# Altium schematic symbol library BARKO_SCHLIB.SchLib: 1064 symbols (part 10 of 11) (continued)
## R-430R-1206 (continued)
RES 430 OHM 1% 1/4W 1206; Manufacturer: Stackpole Electronics; Manufacturer Part Number: RMCF1206FT430R; Max Power Dissipation: 250mW; Temperature Coefficient: 100ppm/°C; .Creator: M.OZKAN; .PCBCHK: USED; Supplier 1: Digi-Key; Supplier Part Number 1: RMCF1206FT430RCT-ND; Stock: 2230; Pricing: 1=0.1, 10=0.034, 100=0.014, 1000=0.0063, 2500=0.0055 (USD); RoHS: Yes; Mount: Surface Mount; Contact Plating: Tin,Matte; Case Code (Imperial): 1206; Case Code (Metric): 3216; Min Operating Temperature: -55°C; Max Operating Temperature: 155°C; Packaging: Tape and Reel; Resistance: 430R; Package Quantity: 5000; Features: Automotive AEC-Q200; Number of Terminations: 2; Composition: Thick Film; Length: 0.126inch; Height: 0.028inch; Width: 0.063inch; Radiation Hardening: No; ComponentLink1URL: https://www.seielect.com/catalog/SEI-RMCF_RMCP.pdf?src-supplier=Avnet; ComponentLink1Description: https://www.seielect.com/catalog/SEI-RMCF_RMCP.pdf?src-supplier=Avnet; ComponentLink2URL: https://www.seielect.com/Catalog/SEI-RMCF_RMCP.pdf?src-supplier=Digi-Key; ComponentLink2Description: https://www.seielect.com/Catalog/SEI-RMCF_RMCP.pdf?src-supplier=Digi-Key; ComponentLink3URL: http://www.seielect.com/Catalog/SEI-RMCF_RMCP.pdf?src-supplier=Digi-Key; ComponentLink3Description: http://www.seielect.com/Catalog/SEI-RMCF_RMCP.pdf?src-supplier=Digi-Key; .SCHCHK: USED
footprint R-1206
pins: 1, 2

## R-470-0603-0.1
designator R?, comment 470R  Tolerance: 0.1%  Case/Package: 0603
RES SMD 470 OHM 0.1% 1/5W 0603; Manufacturer: Panasonic; Manufacturer Part Number: ERJ-PB3B4700V; Max Power Dissipation: 200mW; Temperature Coefficient: 50ppm/°C; Supplier 1: Digi-Key; Supplier Part Number 1: P19934CT-ND; Stock: 5949; Pricing: 1=0.23, 10=0.191, 25=0.1392, 50=0.101, 100=0.0748, 250=0.0574, 500=0.0452, 1000=0.0313 (USD); RoHS: Yes; Case Code (Metric): 1608; Case Code (Imperial): 0603; Min Operating Temperature: -55°C; Max Operating Temperature: 155°C; Packaging: Tape and Reel; Resistance: 470R; Resistor Type: Thick Film; Number of Terminations: 2; Features: Automotive AEC-Q200; Length: 0.063inch; Width: 0.032inch; Height - Seated (Max): 0.022inch; ComponentLink1URL: https://industrial.panasonic.com/sa/system/files/data/download/catalog/id_fixed-resistors_e_2.pdf?src-supplier=Digi-Key; ComponentLink1Description: https://industrial.panasonic.com/sa/system/files/data/download/catalog/id_fixed-resistors_e_2.pdf?src-supplier=Digi-Key
footprint R-0603
pins: 1, 2

## R-470K-0805
designator R?, comment 470K  Case Code (Imperial): 0805
RES SMD 470K 1/8W5%  0805; Manufacturer: Panasonic; Manufacturer Part Number: ERJ-6ENF4703V; Resistance: 470kR; Tolerance: 1%; Temperature Coefficient: 100ppm/°C; Max Power Dissipation: 125mW; Voltage Rating: 150V; .PCBCHK: USED; .Creator: F:TALI; Washability: OK; Stock 1: 202505; Pricing 1: 1=0.1, 10=0.081, 100=0.0311, 1000=0.01367, 2500=0.01181 (USD); Mount: Surface Mount; Case/Package: 0805; Number of Pins: 2; Case Code (Metric): 2012; Contact Plating: Tin; Min Operating Temperature: -55°C; Max Operating Temperature: 155°C; Packaging: Tape and Reel; Composition: Thick Film; Number of Terminations: 2; Features: Automotive AEC-Q200; Package Quantity: 1; Military Standard: Not; Power Rating: 125mW; Termination: SMD/SMT; Length: 2mm; Height: 0.6mm; Width: 1.2mm; Depth: 1.25mm; Radiation Hardening: No; REACH SVHC: No SVHC; ComponentLink1URL: http://www.farnell.com/datasheets/1678782.pdf; ComponentLink1Description: http://www.farnell.com/datasheets/1678782.pdf; ComponentLink2URL: http://www.mouser.com/ds/2/315/AOA0000CE2-37512.pdf; ComponentLink2Description: http://www.mouser.com/ds/2/315/AOA0000CE2-37512.pdf; ComponentLink3URL: https://www.alliedelec.com/m/d/623f45ff1957d936ff56d46fd1c28cac.pdf; ComponentLink3Description: https://www.alliedelec.com/m/d/623f45ff1957d936ff56d46fd1c28cac.pdf; ComponentLink4URL: http://www.farnell.com/datasheets/426256.pdf; ComponentLink4Description: http://www.farnell.com/datasheets/426256.pdf; ComponentLink5URL: http://industrial.panasonic.com/www-data/pdf/AOA0000/AOA0000CE2.pdf; ComponentLink5Description: http://industrial.panasonic.com/www-data/pdf/AOA0000/AOA0000CE2.pdf; Stock 2: 199283; Pricing 2: 1=0.1, 10=0.059, 100=0.024, 1000=0.01079, 2500=0.00936 (USD); Voltage Rating (DC): 150V; Lead Free: Lead Free; ComponentLink6URL: http://www.samsungsem.com/kr/support/product-search/chip-resistor/RC2012F474CS.jsp; ComponentLink6Description: http://www.samsungsem.com/kr/support/product-search/chip-resistor/RC2012F474CS.jsp; ComponentLink7URL: http://www.samsungsem.com/kr/support/library/product-catalog/__icsFiles/afieldfile/2015/09/22/CHIP_RESISTOR_2015.pdf; ComponentLink7Description: http://www.samsungsem.com/kr/support/library/product-catalog/__icsFiles/afieldfile/2015/09/22/CHIP_RESISTOR_2015.pdf; Stock 3: 30342; Pricing 3: 1=0.1, 10=0.021, 100=0.0086, 1000=0.00385, 2500=0.00334 (USD); .SCHCHK: USED; Supplier 1: Digi-Key; Supplier Part Number 1: RMCF0805JT470KDKR-ND
footprint R-0805
pins: 1, 2

## R-470R-0603
designator R?, comment 470R  Case Code (Imperial): 0603
RES SMD 470 OHM 5% 1/10W 0603; Manufacturer: Yageo; Manufacturer Part Number: RC0603JR-07470RL; Temperature Coefficient: 100ppm/°C; Voltage Rating (DC): 50V; Power Rating: 100mW; .PCBCHK: USED; .Creator: F:TALI; Washability: OK; Stock 1: 0; Pricing 1: 1=0.1, 10=0.022, 100=0.0088, 1000=0.00396, 2500=0.00344 (USD); Case/Package: 0603; Number of Pins: 2; Case Code (Metric): 1608; Min Operating Temperature: -55°C; Max Operating Temperature: 155°C; Resistance: 470R; Tolerance: 5%; Composition: Thick Film; Packaging: Tape and Reel; Voltage Rating: 50V; Package Quantity: 1; Termination: SMD/SMT; Number of Terminations: 2; Military Standard: Not; Max Power Dissipation: 100mW; Features: Moisture Resistant; Length: 0.063inch; Height: 0.022inch; Width: 0.031inch; Depth: 0.8mm; REACH SVHC: No SVHC; Lead Free: Lead Free; ComponentLink1URL: http://www.yageo.com/documents/recent/PYu-RC_Group_51_RoHS_L_9.pdf; ComponentLink1Description: http://www.yageo.com/documents/recent/PYu-RC_Group_51_RoHS_L_9.pdf; ComponentLink2URL: http://www.farnell.com/datasheets/443971.pdf; ComponentLink2Description: http://www.farnell.com/datasheets/443971.pdf; Stock 2: 2603; Pricing 2: 1=0.1, 10=0.044, 100=0.0178, 1000=0.00798, 2500=0.00693 (USD); Stock 3: 2783393; Pricing 3: 1=0.1, 10=0.043, 100=0.0176, 1000=0.00791, 2500=0.00686 (USD); Mount: Surface Mount; Weight: 7.1E-05oz; Contact Plating: Tin; Radiation Hardening: No; ComponentLink3URL: http://www.farnell.com/datasheets/1678796.pdf; ComponentLink3Description: http://www.farnell.com/datasheets/1678796.pdf; ComponentLink4URL: http://industrial.panasonic.com/www-data/pdf/AOA0000/AOA0000CE1.pdf; ComponentLink4Description: http://industrial.panasonic.com/www-data/pdf/AOA0000/AOA0000CE1.pdf; ComponentLink5URL: https://www.alliedelec.com/m/d/51cd0790071e1666bdb9d00c57fcf960.pdf; ComponentLink5Description: https://www.alliedelec.com/m/d/51cd0790071e1666bdb9d00c57fcf960.pdf; ComponentLink6URL: https://www.verical.com/server-webapp/html/getDatasheet?partID=33087; ComponentLink6Description: https://www.verical.com/server-webapp/html/getDatasheet?partID=33087; ComponentLink7URL: http://www.farnell.com/datasheets/2059623.pdf; ComponentLink7Description: http://www.farnell.com/datasheets/2059623.pdf; ComponentLink8URL: https://www.verical.com/server-webapp/html/getDatasheet?partID=493439; ComponentLink8Description: https://www.verical.com/server-webapp/html/getDatasheet?partID=493439; .SCHCHK: USED; Supplier 1: Digi-Key; Supplier Part Number 1: 311-470GRDKR-ND
footprint R-0603
pins: 1, 2

## R-470R-0804
designator R?, comment 470R
RES ARRAY 4 RES 470 OHM 0804; Manufacturer: Stackpole Electronics; Manufacturer Part Number: RAVF104DJT470R; Circuit Type: Isolated; Number of Resistors: 4; Power Per Element: 62.5mW; Tolerance: 5%; Temperature Coefficient: 200ppm/°C; Supplier 1: Digi-Key; RoHS: Yes; Category: Resistor Arrays; Stock 1: 9036; Pricing 1: 1=0.10000, 10=0.05800, 25=0.04200, 50=0.03200, 100=0.02360, 250=0.01800, 500=0.01440, 1000=0.01060, 5000=0.00760 (USD); Mount: Surface Mount; Case/Package: 0804; Number of Pins: 8; Min Operating Temperature: -55°C; Max Operating Temperature: 155°C; Package Quantity: 1; Resistance: 470R; Packaging: Tape and Reel; Length: 0.079inch; Width: 0.039inch; Height: 0.02inch; ComponentLink1URL: https://www.seielect.com/catalog/SEI-Packaging.pdf?src-supplier=Digi-Key; ComponentLink1Description: https://www.seielect.com/catalog/SEI-Packaging.pdf?src-supplier=Digi-Key; Supplier Part Number 1: RAVF104DJT470RCT-ND
footprint R-0804 (SMD, 8-Leads, Body 2x1mm, Pitch 0.5mm)
pins: 1, 2, 3, 4, 5, 6, 7, 8

## R-470R-0805
designator R?, comment 470R  Case Code (Imperial): 0805
RES SMD 470 OHM 1/8W 5% 0805; Manufacturer: Yageo; Manufacturer Part Number: RC0805JR-07470RL; Power Rating: 125mW; Temperature Coefficient: 100ppm/°C; Voltage Rating: 150V; .PCBCHK: USED; .Creator: F:TALI; Washability: OK; Stock 1: 316867; Pricing 1: 1=0.1, 10=0.039, 100=0.0159, 1000=0.00716, 2500=0.00622 (USD); Case/Package: 0805; Contact Plating: Lead,Matte,Tin; Case Code (Metric): 2012; Min Operating Temperature: -55°C; Max Operating Temperature: 155°C; Tolerance: 5%; Resistance: 470R; Packaging: Tape and Reel; Composition: Thick Film; Termination: SMD/SMT; Military Standard: Not; Length: 2mm; Depth: 1.25mm; Radiation Hardening: No; REACH SVHC: Unknown; Lead Free: Lead Free; ComponentLink1URL: http://www.yageo.com/documents/recent/PYu-RC_Group_51_RoHS_L_9.pdf; ComponentLink1Description: http://www.yageo.com/documents/recent/PYu-RC_Group_51_RoHS_L_9.pdf; ComponentLink2URL: https://www.verical.com/server-webapp/html/getDatasheet?partID=330937; ComponentLink2Description: https://www.verical.com/server-webapp/html/getDatasheet?partID=330937; ComponentLink3URL: http://www.mouser.com/ds/2/447/Yageo_08112016_RC0805-968729.pdf; ComponentLink3Description: http://www.mouser.com/ds/2/447/Yageo_08112016_RC0805-968729.pdf; ComponentLink4URL: http://www.yageo.ru/pdf/RC0805.pdf; ComponentLink4Description: http://www.yageo.ru/pdf/RC0805.pdf; ComponentLink5URL: http://www.farnell.com/datasheets/442941.pdf; ComponentLink5Description: http://www.farnell.com/datasheets/442941.pdf; ComponentLink6URL: http://www.farnell.com/datasheets/444164.pdf; ComponentLink6Description: http://www.farnell.com/datasheets/444164.pdf; Stock 2: 1251140; Pricing 2: 1=0.1, 10=0.061, 100=0.0249, 1000=0.0112, 2500=0.00972 (USD); Mount: Surface Mount; Package Quantity: 5000; Number of Terminations: 2; Max Power Dissipation: 125mW; Voltage Rating (DC): 150V; Height: 0.6mm; Width: 1.25mm; ComponentLink7URL: https://www.alliedelec.com/m/d/51cd0790071e1666bdb9d00c57fcf960.pdf; ComponentLink7Description: https://www.alliedelec.com/m/d/51cd0790071e1666bdb9d00c57fcf960.pdf; ComponentLink8URL: http://industrial.panasonic.com/www-data/pdf/AOA0000/AOA0000CE1.pdf; ComponentLink8Description: http://industrial.panasonic.com/www-data/pdf/AOA0000/AOA0000CE1.pdf; ComponentLink9URL: http://www.farnell.com/datasheets/2371628.pdf; ComponentLink9Description: http://www.farnell.com/datasheets/2371628.pdf; ComponentLink10URL: http://www.mouser.com/ds/2/315/AOA0000CE1-37422.pdf; ComponentLink10Description: http://www.mouser.com/ds/2/315/AOA0000CE1-37422.pdf; ComponentLink11URL: http://www.farnell.com/datasheets/1678796.pdf; ComponentLink11Description: http://www.farnell.com/datasheets/1678796.pdf; ComponentLink12URL: http://www.farnell.com/datasheets/1500035.pdf; ComponentLink12Description: http://www.farnell.com/datasheets/1500035.pdf; ComponentLink13URL: http://www.jameco.com/Jameco/Products/ProdDS/1989922.pdf; ComponentLink13Description: http://www.jameco.com/Jameco/Products/ProdDS/1989922.pdf; Stock 3: 65717; Pricing 3: 1=0.1, 10=0.033, 100=0.0133, 1000=0.00598, 2500=0.00519 (USD); Features: Moisture Resistant; Thickness: 508um; ComponentLink14URL: http://www.farnell.com/datasheets/1791942.pdf; ComponentLink14Description: http://www.farnell.com/datasheets/1791942.pdf; ComponentLink15URL: http://www.bourns.com/pdfs/chpreztr.pdf; ComponentLink15Description: http://www.bourns.com/pdfs/chpreztr.pdf; ComponentLink16URL: https://www.bourns.com/docs/Product-Datasheets/CHPREZTR.pdf; ComponentLink16Description: https://www.bourns.com/docs/Product-Datasheets/CHPREZTR.pdf; ComponentLink17URL: http://www.bourns.com/docs/Product-Datasheets/CHPREZTR.pdf; ComponentLink17Description: http://www.bourns.com/docs/Product-Datasheets/CHPREZTR.pdf; .SCHCHK: USED; Supplier 1: Digi-Key; Supplier Part Number 1: 311-470ARCT-ND
footprint R-0805
pins: 1, 2

## R-470R-1206 Array
designator R?, comment 470R
RES ARRAY 4 RES 470 OHM 0804; Manufacturer: Stackpole Electronics; Manufacturer Part Number: RAVF104DJT470R; Circuit Type: Isolated; Number of Resistors: 4; Power Per Element: 62.5mW; Tolerance: 5%; Temperature Coefficient: 200ppm/°C; Supplier 1: Digi-Key; RoHS: Yes; Category: Resistor Arrays; Stock 1: 9036; Pricing 1: 1=0.10000, 10=0.05800, 25=0.04200, 50=0.03200, 100=0.02360, 250=0.01800, 500=0.01440, 1000=0.01060, 5000=0.00760 (USD); Mount: Surface Mount; Case/Package: 0804; Number of Pins: 8; Min Operating Temperature: -55°C; Max Operating Temperature: 155°C; Package Quantity: 1; Resistance: 470R; Packaging: Tape and Reel; Length: 0.079inch; Width: 0.039inch; Height: 0.02inch; ComponentLink1URL: https://www.seielect.com/catalog/SEI-Packaging.pdf?src-supplier=Digi-Key; ComponentLink1Description: https://www.seielect.com/catalog/SEI-Packaging.pdf?src-supplier=Digi-Key; Supplier Part Number 1: RAVF104DJT470RCT-ND
footprint R-1206-ARRAY (SMD, 8-Leads, Body 1.6x3.2mm, Pitch 0.8mm)
pins: 1, 2, 3, 4, 5, 6, 7, 8

## R-470R-2512
designator R?, comment 470R  Case/Package: 2512  Power Rating: 1W
RES SMD 470 OHM 1% 1W 2512; Manufacturer: Stackpole Electronics; Manufacturer Part Number: CQ121WF4700T4E; Temperature Coefficient: 100ppm/°C; Supplier 1: Digi-Key; Supplier Part Number 1: RMCF2512FT470RCT-ND; Stock: 5190; Pricing: 1=0.34, 10=0.292, 100=0.114, 1000=0.0477 (USD); RoHS: Yes; Mount: Surface Mount; Case Code (Imperial): 2512; Contact Plating: Tin,Matte; Case Code (Metric): 6432; Min Operating Temperature: -55°C; Max Operating Temperature: 155°C; Composition: Thick Film; Number of Terminations: 2; Features: Automotive AEC-Q200; Packaging: Tape and Reel; Resistance: 470R; Length: 0.248inch; Height: 0.028inch; Width: 0.126inch; Radiation Hardening: No; Lead Free: Lead Free; ComponentLink1URL: https://www.seielect.com/Catalog/SEI-RMCF_RMCP.pdf?src-supplier=Digi-Key; ComponentLink1Description: https://www.seielect.com/Catalog/SEI-RMCF_RMCP.pdf?src-supplier=Digi-Key; ComponentLink2URL: https://www.seielect.com/catalog/SEI-Packaging.pdf?src-supplier=Digi-Key; ComponentLink2Description: https://www.seielect.com/catalog/SEI-Packaging.pdf?src-supplier=Digi-Key; ComponentLink3URL: https://www.seielect.com/catalog/SEI-RMCF_RMCP.pdf?src-supplier=Avnet; ComponentLink3Description: https://www.seielect.com/catalog/SEI-RMCF_RMCP.pdf?src-supplier=Avnet; Max Power Dissipation: 1W; Tolerance: 1%
footprint R-2512
pins: 1, 2

## R-499R-0402
designator R?, comment 499R  Case/Package: 0402
RES SMD 499 OHM 1% 1/10W 0402; Manufacturer: Panasonic; Manufacturer Part Number: ERJ-2RKF4990X; Power Rating: 100mW; Voltage Rating: 50V; Temperature Coefficient: 100ppm/°C; Washability: OK; .Creator: M.OZKAN; .PCBCHK: USED; Supplier 1: Digi-Key; Stock 1: 4738237; Pricing 1: 1=0.10000, 10=0.04100, 100=0.01670, 1000=0.00751, 2500=0.00652, 5000=0.00538 (USD); RoHS: Yes; Mount: Surface Mount; Case Code (Metric): 1005; Case Code (Imperial): 0402; Contact Plating: Tin; Min Operating Temperature: -55°C; Max Operating Temperature: 155°C; Resistance: 499R; Tolerance: 1%; Packaging: Tape and Reel; Package Quantity: 1; Composition: Thick Film; Number of Terminations: 2; Termination: SMD/SMT; Military Standard: Not; Max Power Dissipation: 100mW; Voltage Rating (DC): 50V; Features: Automotive AEC-Q200; Length: 1mm; Height: 0.35mm; Width: 0.02inch; Depth: 0.5mm; REACH SVHC: No SVHC; Lead Free: Lead Free; ComponentLink1URL: https://datasheet.ciiva.com/9181/aoa0000ce2-9181461.pdf?src-supplier=Avnet; ComponentLink1Description: https://datasheet.ciiva.com/9181/aoa0000ce2-9181461.pdf?src-supplier=Avnet; ComponentLink2URL: https://datasheet.ciiva.com/28695/1678782-28695781.pdf?src-supplier=Element14; ComponentLink2Description: https://datasheet.ciiva.com/28695/1678782-28695781.pdf?src-supplier=Element14; ComponentLink3URL: https://datasheet.ciiva.com/22749/1678782-22749610.pdf?src-supplier=Element14; ComponentLink3Description: https://datasheet.ciiva.com/22749/1678782-22749610.pdf?src-supplier=Element14; ComponentLink4URL: https://datasheet.ciiva.com/16508/aoa0000ce2-16508382.pdf?src-supplier=Future+Electronics; ComponentLink4Description: https://datasheet.ciiva.com/16508/aoa0000ce2-16508382.pdf?src-supplier=Future+Electronics; ComponentLink5URL: https://datasheet.ciiva.com/16765/70260748-16765054.pdf?src-supplier=Allied+Electronics; ComponentLink5Description: https://datasheet.ciiva.com/16765/70260748-16765054.pdf?src-supplier=Allied+Electronics; ComponentLink6URL: https://datasheet.ciiva.com/16766/70260748-16766015.pdf?src-supplier=Allied+Electronics; ComponentLink6Description: https://datasheet.ciiva.com/16766/70260748-16766015.pdf?src-supplier=Allied+Electronics; ComponentLink7URL: https://datasheet.ciiva.com/6201/426256-6201373.pdf?src-supplier=Farnell; ComponentLink7Description: https://datasheet.ciiva.com/6201/426256-6201373.pdf?src-supplier=Farnell; ComponentLink8URL: https://datasheet.ciiva.com/46377/426256-46377550.pdf?src-supplier=Element14; ComponentLink8Description: https://datasheet.ciiva.com/46377/426256-46377550.pdf?src-supplier=Element14; Supplier Part Number 1: P499LDKR-ND; .SCHCHK: USED
footprint R-0402
pins: 1, 2

## R-560R-0603
designator R?, comment 560R  Tolerance: 1%  Case/Package: 0603
RES 560 OHM 1% 1/10W 0603; Manufacturer: Stackpole Electronics; Manufacturer Part Number: RMCF0603FT560R; Max Power Dissipation: 100mW; Temperature Coefficient: 100ppm/°C; Washability: OK; .Creator: M.OZKAN; .PCBCHK: USED; Supplier 1: Digi-Key; Supplier Part Number 1: 738-RMCF0603FT560RCT-ND; Stock: 13434; Pricing: 1=0.1, 10=0.016, 100=0.0065, 1000=0.0029, 2500=0.0025 (USD); RoHS: Yes; Mount: Surface Mount; Case Code (Imperial): 0603; Contact Plating: Tin,Matte; Case Code (Metric): 1608; Min Operating Temperature: -55°C; Max Operating Temperature: 155°C; Number of Terminations: 2; Packaging: Tape and Reel; Resistance: 560R; Features: Automotive AEC-Q200; Composition: Thick Film; Length: 0.061inch; Height: 0.022inch; Width: 0.031inch; Radiation Hardening: No; ComponentLink1URL: http://components.arrow.com/part/dataview/50496401S229652N1174?src-supplier=Arrow; ComponentLink1Description: http://components.arrow.com/part/dataview/50496401S229652N1174?src-supplier=Arrow; ComponentLink2URL: https://www.seielect.com/catalog/SEI-RMCF_RMCP.pdf?src-supplier=Avnet; ComponentLink2Description: https://www.seielect.com/catalog/SEI-RMCF_RMCP.pdf?src-supplier=Avnet; ComponentLink3URL: https://www.seielect.com/catalog/SEI-Packaging.pdf?src-supplier=Digi-Key; ComponentLink3Description: https://www.seielect.com/catalog/SEI-Packaging.pdf?src-supplier=Digi-Key; .SCHCHK: USED
footprint R-0603
pins: 1, 2

## R-560R-1206
designator R?, comment 560R  Tolerance: 1%  Case/Package: 1206
RES SMD 560 OHM 1% 1/4W 1206; Manufacturer: Stackpole Electronics; Manufacturer Part Number: RMCF1206FT560R; Max Power Dissipation: 250mW; Temperature Coefficient: 100ppm/°C; .Creator: M.OZKAN; .PCBCHK: USED; Supplier 1: Digi-Key; Supplier Part Number 1: RMCF1206FT560RCT-ND; Stock: 2796; Pricing: 1=0.1, 10=0.034, 100=0.014, 1000=0.0063, 2500=0.0055 (USD); RoHS: Yes; Mount: Surface Mount; Case Code (Imperial): 1206; Contact Plating: Tin,Matte; Case Code (Metric): 3216; Min Operating Temperature: -55°C; Max Operating Temperature: 155°C; Resistance: 560R; Features: Automotive AEC-Q200; Packaging: Tape and Reel; Composition: Thick Film; Number of Terminations: 2; Length: 0.126inch; Height: 0.028inch; Width: 0.063inch; Radiation Hardening: No; Lead Free: Lead Free; ComponentLink1URL: https://www.seielect.com/Catalog/SEI-RMCF_RMCP.pdf?src-supplier=Digi-Key; ComponentLink1Description: https://www.seielect.com/Catalog/SEI-RMCF_RMCP.pdf?src-supplier=Digi-Key; ComponentLink2URL: https://www.seielect.com/catalog/SEI-RMCF_RMCP.pdf?src-supplier=Avnet; ComponentLink2Description: https://www.seielect.com/catalog/SEI-RMCF_RMCP.pdf?src-supplier=Avnet; .SCHCHK: USED
footprint R-1206
pins: 1, 2

## R-680K-0603
designator R?, comment 680K  Tolerance: 1%  Case/Package: 0603
RES 100K OHM 1% 1/10W 0603; Manufacturer: Stackpole Electronics; Manufacturer Part Number: RMCF0603FT100K; Resistance: 100kR; Temperature Coefficient: 100ppm/°C; Max Power Dissipation: 100mW; Working Voltage: 75V; Washability: OK; .Creator: M.OZKAN; .PCBCHK: USED; Supplier 1: Digi-Key; Supplier Part Number 1: RMCF0603FT100KCT-ND; Stock: 1121112; Pricing: 1=0.1, 10=0.016, 100=0.0065, 1000=0.0029, 2500=0.0025 (USD); RoHS: Yes; Mount: Surface Mount; Contact Plating: Tin,Matte; Case Code (Metric): 1608; Case Code (Imperial): 0603; Min Operating Temperature: -55°C; Max Operating Temperature: 155°C; Composition: Thick Film; Features: Automotive AEC-Q200; Packaging: Tape and Reel; Number of Terminations: 2; Power Rating: 100mW; Military Standard: Not; Length: 1.55mm; Height: 0.022inch; Width: 0.031inch; Depth: 0.8mm; Radiation Hardening: No; Lead Free: Lead Free; ComponentLink1URL: https://datasheet.ciiva.com/15193/getdatasheetpartid-362597-15193437.pdf?src-supplier=Verical; ComponentLink1Description: https://datasheet.ciiva.com/15193/getdatasheetpartid-362597-15193437.pdf?src-supplier=Verical; .SCHCHK: USED
footprint R-0603
pins: 1, 2

## R-680R-0805
designator R?, comment 680R  Case/Package: 0805
RES SMD 680 OHM 1/8W 1% 0805; Manufacturer: Stackpole Electronics; Manufacturer Part Number: RMCF0805FT680R; .PCBCHK: USED; .Creator: F:TALI; Washability: OK; Max Power Dissipation: 125mW; Temperature Coefficient: 100ppm/°C; ComponentLink1URL: http://industrial.panasonic.com/www-data/pdf/AOA0000/AOA0000CE1.pdf; ComponentLink1Description: http://industrial.panasonic.com/www-data/pdf/AOA0000/AOA0000CE1.pdf; ComponentLink2URL: http://www.jameco.com/Jameco/Products/ProdDS/1990018.pdf; ComponentLink2Description: http://www.jameco.com/Jameco/Products/ProdDS/1990018.pdf; ComponentLink3URL: http://www.farnell.com/datasheets/1500035.pdf; ComponentLink3Description: http://www.farnell.com/datasheets/1500035.pdf; ComponentLink4URL: https://www.alliedelec.com/m/d/51cd0790071e1666bdb9d00c57fcf960.pdf; ComponentLink4Description: https://www.alliedelec.com/m/d/51cd0790071e1666bdb9d00c57fcf960.pdf; ComponentLink5URL: http://www.farnell.com/datasheets/2059623.pdf; ComponentLink5Description: http://www.farnell.com/datasheets/2059623.pdf; ComponentLink6URL: http://www.farnell.com/datasheets/485442.pdf; ComponentLink6Description: http://www.farnell.com/datasheets/485442.pdf; ComponentLink7URL: http://www.mouser.com/ds/2/315/AOA0000C237-1100991.pdf; ComponentLink7Description: http://www.mouser.com/ds/2/315/AOA0000C237-1100991.pdf; ComponentLink8URL: http://uk.rs-online.com/webdocs/0bee/0900766b80beefcc.pdf; ComponentLink8Description: http://uk.rs-online.com/webdocs/0bee/0900766b80beefcc.pdf; ComponentLink9URL: https://www.distrelec.biz/Web/Downloads/_t/ds/ERA_eng_tds.pdf?mime=application%2Fpdf; ComponentLink9Description: https://www.distrelec.biz/Web/Downloads/_t/ds/ERA_eng_tds.pdf?mime=application%2Fpdf; ComponentLink10URL: http://industrial.panasonic.com/www-data/pdf/AOA0000/AOA0000CE26.pdf; ComponentLink10Description: http://industrial.panasonic.com/www-data/pdf/AOA0000/AOA0000CE26.pdf; ComponentLink11URL: http://www.produktinfo.conrad.com/datenblaetter/450000-474999/452970-da-01-en-WIDERSTAND_0805_ERA.pdf; ComponentLink11Description: http://www.produktinfo.conrad.com/datenblaetter/450000-474999/452970-da-01-en-WIDERSTAND_0805_ERA.pdf; ComponentLink12URL: http://www.farnell.com/datasheets/426256.pdf; ComponentLink12Description: http://www.farnell.com/datasheets/426256.pdf; ComponentLink13URL: https://www.alliedelec.com/m/d/623f45ff1957d936ff56d46fd1c28cac.pdf; ComponentLink13Description: https://www.alliedelec.com/m/d/623f45ff1957d936ff56d46fd1c28cac.pdf; ComponentLink14URL: http://industrial.panasonic.com/www-data/pdf/AOA0000/AOA0000CE2.pdf; ComponentLink14Description: http://industrial.panasonic.com/www-data/pdf/AOA0000/AOA0000CE2.pdf; ComponentLink15URL: http://www.farnell.com/datasheets/1678782.pdf; ComponentLink15Description: http://www.farnell.com/datasheets/1678782.pdf; ComponentLink16URL: http://www.farnell.com/datasheets/442941.pdf; ComponentLink16Description: http://www.farnell.com/datasheets/442941.pdf; .SCHCHK: USED; Supplier 1: Digi-Key; Supplier Part Number 1: RMCF0805FT680RCT-ND; Stock: 22055; Pricing: 1=0.1, 10=0.023, 100=0.0094, 1000=0.0042, 2500=0.0037 (USD); RoHS: Yes; Mount: Surface Mount; Contact Plating: Tin,Matte; Case Code (Imperial): 0805; Case Code (Metric): 2012; Min Operating Temperature: -55°C; Max Operating Temperature: 155°C; Packaging: Tape and Reel; Resistance: 680R; Tolerance: 1%; Resistor Type: Thick Film; Number of Terminations: 2; Features: Automotive AEC-Q200; Length: 0.079inch; Height: 0.026inch; Width: 0.049inch; Radiation Hardening: No; ComponentLink17URL: http://components.arrow.com/part/dataview/40963601S9477768N1174?src-supplier=Arrow+Electronics; ComponentLink17Description: http://components.arrow.com/part/dataview/40963601S9477768N1174?src-supplier=Arrow+Electronics; ComponentLink18URL: https://www.seielect.com/catalog/SEI-RMCF_RMCP.pdf?src-supplier=Avnet; ComponentLink18Description: https://www.seielect.com/catalog/SEI-RMCF_RMCP.pdf?src-supplier=Avnet; ComponentLink19URL: https://www.seielect.com/Catalog/SEI-RMCF_RMCP.pdf?src-supplier=Digi-Key; ComponentLink19Description: https://www.seielect.com/Catalog/SEI-RMCF_RMCP.pdf?src-supplier=Digi-Key; ComponentLink20URL: https://www.seielect.com/catalog/SEI-Packaging.pdf?src-supplier=Digi-Key; ComponentLink20Description: https://www.seielect.com/catalog/SEI-Packaging.pdf?src-supplier=Digi-Key
footprint R-0805
pins: 1, 2

## R-680R-1206
designator R?, comment 680R  Case Code (Imperial): 1206  Power Rating: 1/4W
RES SMD 680 OHM 1% 1/4W 1206; Manufacturer: Yageo; Manufacturer Part Number: RC1206FR-07680RL; Voltage Rating (DC): 200V; Temperature Coefficient: 100ppm/°C; Max Power Dissipation: 250mW; .PCBCHK: USED; .Creator: F:TALI; Washability: OK; Stock 1: 1828286; Pricing 1: 1=0.1, 10=0.081, 100=0.0331, 1000=0.01487, 2500=0.01291 (USD); Case/Package: 1206; Number of Pins: 2; Case Code (Metric): 3216; Min Operating Temperature: -55°C; Max Operating Temperature: 155°C; Voltage Rating: 200V; Resistance: 680R; Packaging: Tape and Reel; Termination: SMD/SMT; Composition: Thick Film; Military Standard: Not; Length: 3.1mm; Height: 0.55mm; Width: 1.6mm; Depth: 1.6mm; REACH SVHC: Unknown; Lead Free: Lead Free; ComponentLink1URL: http://www.farnell.com/datasheets/444357.pdf; ComponentLink1Description: http://www.farnell.com/datasheets/444357.pdf; ComponentLink2URL: http://www.farnell.com/datasheets/1686128.pdf; ComponentLink2Description: http://www.farnell.com/datasheets/1686128.pdf; ComponentLink3URL: http://documents.rs-components.com/techlib://itc_doclist_GB.htm?stockno=6179332; ComponentLink3Description: http://documents.rs-components.com/techlib://itc_doclist_GB.htm?stockno=6179332; ComponentLink4URL: http://www.yageo.com/documents/recent/PYu-RC1206_51_RoHS_L-4.pdf; ComponentLink4Description: http://www.yageo.com/documents/recent/PYu-RC1206_51_RoHS_L-4.pdf; Mount: Surface Mount; Contact Plating: Tin; Package Quantity: 5000; Number of Terminations: 2; Radiation Hardening: No; ComponentLink5URL: https://www.verical.com/server-webapp/html/getDatasheet?partID=32662; ComponentLink5Description: https://www.verical.com/server-webapp/html/getDatasheet?partID=32662; ComponentLink6URL: http://www.mouser.com/ds/2/315/AOA0000C283-1093288.pdf; ComponentLink6Description: http://www.mouser.com/ds/2/315/AOA0000C283-1093288.pdf; ComponentLink7URL: http://industrial.panasonic.com/www-data/pdf/AOA0000/AOA0000CE2.pdf; ComponentLink7Description: http://industrial.panasonic.com/www-data/pdf/AOA0000/AOA0000CE2.pdf; ComponentLink8URL: http://www.farnell.com/datasheets/426256.pdf; ComponentLink8Description: http://www.farnell.com/datasheets/426256.pdf; ComponentLink9URL: https://www.alliedelec.com/m/d/623f45ff1957d936ff56d46fd1c28cac.pdf; ComponentLink9Description: https://www.alliedelec.com/m/d/623f45ff1957d936ff56d46fd1c28cac.pdf; ComponentLink10URL: http://www.farnell.com/datasheets/1678782.pdf; ComponentLink10Description: http://www.farnell.com/datasheets/1678782.pdf; Stock 2: 224070; Pricing 2: 1=0.1, 10=0.07, 100=0.0284, 1000=0.01274, 2500=0.01106 (USD); Features: Moisture Resistant; ComponentLink11URL: http://www.yageo.com/documents/recent/PYu-RC_Group_51_RoHS_L_9.pdf; ComponentLink11Description: http://www.yageo.com/documents/recent/PYu-RC_Group_51_RoHS_L_9.pdf; ComponentLink12URL: https://produktinfo.conrad.com/datenblaetter/400000-424999/402524-da-01-en-SMD_Widerstand_Chip1206_680_Ohm.pdf; ComponentLink12Description: https://produktinfo.conrad.com/datenblaetter/400000-424999/402524-da-01-en-SMD_Widerstand_Chip1206_680_Ohm.pdf; Stock 3: 64500; Pricing 3: 100=0.0169, 1000=0.0069, 5000=0.0043, 15000=0.0038, 50000=0.0035 (USD); Tolerance: 1%; .SCHCHK: USED; Supplier 1: Digi-Key; Supplier Part Number 1: 311-680FRDKR-ND
footprint R-1206
pins: 1, 2

## R-732K-0603
designator R?, comment 732K  Tolerance: 1%  Case/Package: 0603
RES SMD 732K OHM 1% 1/10W 0603; Manufacturer: Yageo; Manufacturer Part Number: RC0603FR-07732KL; Power Rating: 100mW; Resistance: 732kR; Voltage Rating: 50V; Temperature Coefficient: 100ppm/°C; Supplier 1: Digi-Key; Supplier Part Number 1: 311-732KHRCT-ND; Stock: 114415; Pricing: 1=0.1, 10=0.021, 100=0.0085, 1000=0.0038, 2500=0.0033 (USD); RoHS: Yes; Case Code (Imperial): 0603; Case Code (Metric): 1608; Min Operating Temperature: -55°C; Max Operating Temperature: 155°C; Packaging: Tape and Reel; Termination: SMD/SMT; Resistor Type: Thick Film; Voltage Rating (DC): 50V; Length: 1.6mm; Height: 0.45mm; Width: 0.8mm; Depth: 0.8mm; Military Standard: Not; Lead Free: Lead Free; ComponentLink1URL: https://datasheet.ciiva.com/12575/rc0603-272842-12575925.pdf?src-supplier=Mouser; ComponentLink1Description: https://datasheet.ciiva.com/12575/rc0603-272842-12575925.pdf?src-supplier=Mouser
footprint R-0603
pins: 1, 2

## R-750R-0603
designator R?, comment 750R  Case/Package: 0603
RES SMD 750 OHM 1% 1/8W 0603; Manufacturer: Stackpole Electronics; Manufacturer Part Number: RNCP0603FTD750R; Max Power Dissipation: 125mW; Temperature Coefficient: 100ppm/°C; .Creator: M.OZKAN; .PCBCHK: USED; Supplier 1: Digi-Key; Supplier Part Number 1: RNCP0603FTD750RCT-ND; Stock: 10855; Pricing: 1=0.1, 10=0.064, 100=0.026, 1000=0.0117, 2500=0.0101 (USD); RoHS: Yes; Mount: Surface Mount; Case Code (Imperial): 0603; Case Code (Metric): 1608; Min Operating Temperature: -55°C; Max Operating Temperature: 155°C; Composition: Thin Film; Number of Terminations: 2; Features: Moisture Resistant,Anti-Sulfur; Resistance: 750R; Tolerance: 1%; Packaging: Tape and Reel; Length: 0.059inch; Height: 0.02inch; Width: 0.031inch; ComponentLink1URL: http://www.seielect.com/Catalog/SEI-rncp.pdf?src-supplier=Digi-Key; ComponentLink1Description: http://www.seielect.com/Catalog/SEI-rncp.pdf?src-supplier=Digi-Key; ComponentLink2URL: https://www.seielect.com/catalog/SEI-Packaging.pdf?src-supplier=Digi-Key; ComponentLink2Description: https://www.seielect.com/catalog/SEI-Packaging.pdf?src-supplier=Digi-Key; .SCHCHK: USED
footprint R-0603
pins: 1, 2

## R-750R-0805
designator R123?, comment Tolerance: 5%  Case Code (Imperial): 0805  (hidden comment: 750R)
RES SMD 750 OHM 5% 1/8W 0805; Manufacturer: Samsung; Manufacturer Part Number: RC2012J751CS; Max Power Dissipation: 125mW; Temperature Coefficient: 100ppm/°C; Voltage Rating (DC): 150V; .PCBCHK: USED; .Creator: F:TALI; Washability: OK; Stock 1: 2197; Pricing 1: 1=0.1, 10=0.052, 100=0.021, 1000=0.00942 (USD); Case/Package: 0805; Case Code (Metric): 2012; Contact Plating: Tin; Min Operating Temperature: -55°C; Max Operating Temperature: 155°C; Packaging: Tape and Reel; Composition: Thick Film; Number of Terminations: 2; Features: Moisture Resistant; Length: 0.079inch; Height: 0.024inch; Width: 0.049inch; Radiation Hardening: No; Lead Free: Lead Free; ComponentLink1URL: http://www.samsungsem.com/kr/support/library/product-catalog/__icsFiles/afieldfile/2015/09/22/CHIP_RESISTOR_2015.pdf; ComponentLink1Description: http://www.samsungsem.com/kr/support/library/product-catalog/__icsFiles/afieldfile/2015/09/22/CHIP_RESISTOR_2015.pdf; Stock 2: 159914; Pricing 2: 1=0.1, 10=0.081, 100=0.0311, 1000=0.01367, 2500=0.01181 (USD); Mount: Surface Mount; Military Standard: Not; Power Rating: 125mW; Voltage Rating: 150V; Package Quantity: 5000; Termination: SMD/SMT; Depth: 1.25mm; REACH SVHC: No SVHC; ComponentLink2URL: http://www.farnell.com/datasheets/1678782.pdf; ComponentLink2Description: http://www.farnell.com/datasheets/1678782.pdf; ComponentLink3URL: http://www.alliedelec.com/m/d/623f45ff1957d936ff56d46fd1c28cac.pdf; ComponentLink3Description: http://www.alliedelec.com/m/d/623f45ff1957d936ff56d46fd1c28cac.pdf; ComponentLink4URL: http://industrial.panasonic.com/www-data/pdf/AOA0000/AOA0000CE2.pdf; ComponentLink4Description: http://industrial.panasonic.com/www-data/pdf/AOA0000/AOA0000CE2.pdf; ComponentLink5URL: http://www.farnell.com/datasheets/1911175.pdf; ComponentLink5Description: http://www.farnell.com/datasheets/1911175.pdf; Stock 3: 17001; Pricing 3: 1=0.1, 10=0.039, 100=0.0159, 1000=0.00716, 2500=0.00622 (USD); ComponentLink6URL: http://www.yageo.com.tw/exep/pages/download/literatures/PYu-R_INT-thick_7.pdf; ComponentLink6Description: http://www.yageo.com.tw/exep/pages/download/literatures/PYu-R_INT-thick_7.pdf; ComponentLink7URL: http://www.yageo.com/documents/recent/PYu-RC_Group_51_RoHS_L_9.pdf; ComponentLink7Description: http://www.yageo.com/documents/recent/PYu-RC_Group_51_RoHS_L_9.pdf; ComponentLink8URL: http://www.yageo.ru/pdf/RC0805.pdf; ComponentLink8Description: http://www.yageo.ru/pdf/RC0805.pdf; .SCHCHK: USED; Supplier 1: Digi-Key; Supplier Part Number 1: 1276-5528-1-ND; Resistance: 750R
footprint R-0805
pins: 1, 2

## R-750R-1206
designator R?, comment 750R  Max Power Dissipation: 1/4W  Case Code (Imperial): 1206
RES SMD 750 OHM 1% 1/4W 1206; Manufacturer: Yageo; Manufacturer Part Number: RC1206FR-07750RL; Temperature Coefficient: 100ppm/°C; Power Rating: 250mW; Voltage Rating: 200V; .PCBCHK: USED; .Creator: F:TALI; Washability: OK; Stock 1: 1762; Pricing 1: 1=0.1, 10=0.081, 100=0.0331, 1000=0.01487, 2500=0.01291 (USD); Mount: Surface Mount; Case/Package: 1206; Contact Plating: Matte,Tin; Case Code (Metric): 3216; Min Operating Temperature: -55°C; Max Operating Temperature: 155°C; Tolerance: 1%; Resistance: 750R; Composition: Thick Film; Packaging: Tape and Reel; Termination: SMD/SMT; Military Standard: Not; Voltage Rating (DC): 200V; Working Voltage: 200V; Number of Terminations: 2; Length: 3.1mm; Height: 0.55mm; Depth: 1.6mm; Width: 1.6mm; Radiation Hardening: No; Lead Free: Lead Free; ComponentLink1URL: http://documents.rs-components.com/techlib://itc_doclist_GB.htm?stockno=6178711; ComponentLink1Description: http://documents.rs-components.com/techlib://itc_doclist_GB.htm?stockno=6178711; Stock 2: 68193; Pricing 2: 1=0.1, 10=0.084, 100=0.0322, 1000=0.01416, 2500=0.01223 (USD); Weight: 0.000353oz; Package Quantity: 10; Features: Automotive AEC-Q200; REACH SVHC: Unknown; ComponentLink2URL: http://www.mouser.com/ds/2/427/dcrcwe3-109170.pdf; ComponentLink2Description: http://www.mouser.com/ds/2/427/dcrcwe3-109170.pdf; ComponentLink3URL: https://www.verical.com/server-webapp/html/getDatasheet?partID=32649; ComponentLink3Description: https://www.verical.com/server-webapp/html/getDatasheet?partID=32649; ComponentLink4URL: http://www.vishay.com/docs/20035/dcrcwe3.pdf; ComponentLink4Description: http://www.vishay.com/docs/20035/dcrcwe3.pdf; ComponentLink5URL: http://uk.rs-online.com/webdocs/0d98/0900766b80d98b5e.pdf; ComponentLink5Description: http://uk.rs-online.com/webdocs/0d98/0900766b80d98b5e.pdf; Stock 3: 27769; Pricing 3: 1=0.1, 10=0.044, 100=0.018, 1000=0.0081, 2500=0.00703 (USD); Thickness: 610um; ComponentLink6URL: http://www.bourns.com/docs/Product-Datasheets/CHPREZTR.pdf; ComponentLink6Description: http://www.bourns.com/docs/Product-Datasheets/CHPREZTR.pdf; ComponentLink7URL: http://www.bourns.com/pdfs/chpreztr.pdf; ComponentLink7Description: http://www.bourns.com/pdfs/chpreztr.pdf; .SCHCHK: USED; Supplier 1: Digi-Key; Supplier Part Number 1: 311-750FRDKR-ND
footprint R-1206
pins: 1, 2

## R-820R-0603
designator R?, comment 820R  Tolerance: 1%  Case Code (Imperial): 0603
RES SMD 820 OHM 1% 1/10W 0603; Manufacturer: Panasonic; Manufacturer Part Number: ERJ-3EKF8200V; Temperature Coefficient: 100ppm/°C; Power Rating: 100mW; Voltage Rating (DC): 75V; .PCBCHK: USED; .Creator: F:TALI; Washability: OK; Stock 1: 449122; Pricing 1: 1=0.1, 10=0.065, 100=0.0264, 1000=0.01186, 2500=0.01029 (USD); Mount: Surface Mount; Case/Package: 0603; Number of Pins: 2; Case Code (Metric): 1608; Contact Plating: Tin; Min Operating Temperature: -55°C; Max Operating Temperature: 155°C; Resistance: 820R; Composition: Thick Film; Packaging: Tape and Reel; Number of Terminations: 2; Max Power Dissipation: 100mW; Military Standard: Not; Package Quantity: 5000; Voltage Rating: 75V; Termination: SMD/SMT; Features: Automotive AEC-Q200; Length: 1.6mm; Height: 0.022inch; Width: 0.031inch; Depth: 0.8mm; Radiation Hardening: No; Lead Free: Lead Free; REACH SVHC: No SVHC; ComponentLink1URL: http://industrial.panasonic.com/www-data/pdf/AOA0000/AOA0000CE2.pdf; ComponentLink1Description: http://industrial.panasonic.com/www-data/pdf/AOA0000/AOA0000CE2.pdf; ComponentLink2URL: https://www.alliedelec.com/m/d/623f45ff1957d936ff56d46fd1c28cac.pdf; ComponentLink2Description: https://www.alliedelec.com/m/d/623f45ff1957d936ff56d46fd1c28cac.pdf; ComponentLink3URL: http://www.farnell.com/datasheets/426256.pdf; ComponentLink3Description: http://www.farnell.com/datasheets/426256.pdf; ComponentLink4URL: http://www.farnell.com/datasheets/1678782.pdf; ComponentLink4Description: http://www.farnell.com/datasheets/1678782.pdf; ComponentLink5URL: http://www.mouser.com/ds/2/315/AOA0000C283-1093288.pdf; ComponentLink5Description: http://www.mouser.com/ds/2/315/AOA0000C283-1093288.pdf; Stock 2: 230000; Pricing 2: 5000=0.0033, 10000=0.00287, 25000=0.00252, 50000=0.00231, 125000=0.00229 (USD); ComponentLink6URL: http://www.samsungsem.com/kr/support/product-search/chip-resistor/RC1608J821CS.jsp; ComponentLink6Description: http://www.samsungsem.com/kr/support/product-search/chip-resistor/RC1608J821CS.jsp; ComponentLink7URL: http://www.samsungsem.com/kr/support/library/product-catalog/__icsFiles/afieldfile/2015/09/22/CHIP_RESISTOR_2015.pdf; ComponentLink7Description: http://www.samsungsem.com/kr/support/library/product-catalog/__icsFiles/afieldfile/2015/09/22/CHIP_RESISTOR_2015.pdf; Stock 3: 63500; Pricing 3: 100=0.0172, 1000=0.0073, 5000=0.00312 (USD); .SCHCHK: USED; Supplier 1: Digi-Key; Supplier Part Number 1: P820HDKR-ND
footprint R-0603
pins: 1, 2

## R-910K-0603
designator R?, comment 910K  Tolerance: 0.1%  Case Code (Imperial): 0603
RES SMD 910K OHM 0.1% 1/16W 0603; Manufacturer: TE Connectivity; Manufacturer Part Number: 1-1879417-8; Resistance: 910kR; Temperature Coefficient: 25ppm/°C; Max Power Dissipation: 63mW; .PCBCHK: USED; .Creator: F:TALI; Washability: OK; Supplier 1: Digi-Key; Supplier Part Number 1: A102324DKR-ND; Stock 1: 13322; Pricing 1: 1=0.68, 10=0.486, 100=0.2529 (USD); Case/Package: 0603; Case Code (Metric): 1608; Min Operating Temperature: -55°C; Max Operating Temperature: 155°C; Packaging: Tape and Reel; Composition: Thin Film; Number of Terminations: 2; Package Quantity: 1000; Military Standard: Not; Length: 0.061inch; Height: 0.022inch; Width: 0.031inch; Depth: 0.8mm; ComponentLink1URL: http://www.te.com/commerce/DocumentDelivery/DDEController?Action=srchrtrv&DocNm=1773200&DocType=DS&DocLang=English; ComponentLink1Description: http://www.te.com/commerce/DocumentDelivery/DDEController?Action=srchrtrv&DocNm=1773200&DocType=DS&DocLang=English; .SCHCHK: USED
footprint R-0603
pins: 1, 2

## R-910R-0603
designator R?, comment 910R  Tolerance: 0.1%  Case Code (Imperial): 0603
RES SMD 910 OHM 0.1% 1/16W 0603; Manufacturer: TE Connectivity; Manufacturer Part Number: 5-1676481-4; Temperature Coefficient: 25ppm/°C; Max Power Dissipation: 63mW; Power Rating: 100mW; Voltage Rating: 75V; Voltage Rating (DC): 50V; .PCBCHK: USED; .Creator: F:TALI; Washability: OK; Stock 1: 1077; Pricing 1: 1=0.68, 10=0.486, 100=0.2529 (USD); Case/Package: 0603; Case Code (Metric): 1608; Contact Plating: Tin; Min Operating Temperature: -55°C; Max Operating Temperature: 155°C; Package Quantity: 1; Resistance: 910R; Packaging: Tape and Reel; Composition: Thin Film; Number of Terminations: 2; Length: 0.061inch; Height: 0.022inch; Width: 0.031inch; Radiation Hardening: No; ComponentLink1URL: http://www.te.com/commerce/DocumentDelivery/DDEController?Action=srchrtrv&DocNm=1676481&DocType=Customer+Drawing&DocLang=English; ComponentLink1Description: http://www.te.com/commerce/DocumentDelivery/DDEController?Action=srchrtrv&DocNm=1676481&DocType=Customer+Drawing&DocLang=English; ComponentLink2URL: http://www.te.com/commerce/DocumentDelivery/DDEController?Action=srchrtrv&DocNm=1773200&DocType=DS&DocLang=English; ComponentLink2Description: http://www.te.com/commerce/DocumentDelivery/DDEController?Action=srchrtrv&DocNm=1773200&DocType=DS&DocLang=English; Stock 2: 16464; Pricing 2: 1=0.39, 10=0.332, 100=0.1298, 1000=0.05435, 2500=0.04982 (USD); Weight: 7.1E-05oz; Termination: SMD/SMT; Features: Moisture Resistant; Lead Free: Lead Free; ComponentLink3URL: http://www.yageo.com/documents/recent/PYu-RT_1-to-0.05_RoHS_L_6.pdf; ComponentLink3Description: http://www.yageo.com/documents/recent/PYu-RT_1-to-0.05_RoHS_L_6.pdf; ComponentLink4URL: http://www.mouser.com/ds/2/447/yageodocoutput-1125656.pdf; ComponentLink4Description: http://www.mouser.com/ds/2/447/yageodocoutput-1125656.pdf; Stock 3: 25153; Pricing 3: 1=0.35, 10=0.3, 100=0.1172, 1000=0.04906, 2500=0.04498 (USD); Mount: Surface Mount; Number of Pins: 2; Military Standard: Not; Depth: 0.8mm; REACH SVHC: No SVHC; ComponentLink5URL: http://www.mouser.com/ds/2/315/AOA0000C237-1100991.pdf; ComponentLink5Description: http://www.mouser.com/ds/2/315/AOA0000C237-1100991.pdf; ComponentLink6URL: https://www.distrelec.biz/Web/Downloads/_t/ds/ERA_eng_tds.pdf?mime=application%2Fpdf; ComponentLink6Description: https://www.distrelec.biz/Web/Downloads/_t/ds/ERA_eng_tds.pdf?mime=application%2Fpdf; ComponentLink7URL: http://www.farnell.com/datasheets/485442.pdf; ComponentLink7Description: http://www.farnell.com/datasheets/485442.pdf; ComponentLink8URL: http://industrial.panasonic.com/www-data/pdf/AOA0000/AOA0000CE26.pdf; ComponentLink8Description: http://industrial.panasonic.com/www-data/pdf/AOA0000/AOA0000CE26.pdf; ComponentLink9URL: https://produktinfo.conrad.com/datenblaetter/450000-474999/450735-da-01-en-WIDERSTAND_0603_ERA.pdf; ComponentLink9Description: https://produktinfo.conrad.com/datenblaetter/450000-474999/450735-da-01-en-WIDERSTAND_0603_ERA.pdf; .SCHCHK: USED; Supplier 1: Digi-Key; Supplier Part Number 1: A103136CT-ND
footprint R-0603
pins: 1, 2

## R-910R-0603_1
designator R?, comment 910R  Case Code (Imperial): 0603